# Altium schematic symbol library jlcpcb_2025_04_resistors_extended_2512.schlib: 2667 symbols (part 2 of 14) (continued)
## 25121WJ016JT4E
designator R?  Resistance: 1.6Ω  (hidden comment: *)
Resistor, 1.6Ω, ±5%, 1W, 200V, ±200ppm/℃, -55℃~+155℃, SMD 2512; Manufacturer: Uniroyal; Manufacturer Part Number: 25121WJ016JT4E; Supplier 1: LCSC; Supplier Part Number 1: C621287; JLCPCB Part Number: C621287; Power Rating: 1W; Category: Resistors; Package Size: 2512; JLCPCB Basic Part: Yes; Tolerance: ±5%; Voltage Rating: 200V; Temperature Coefficient: ±200ppm/℃; Temperature Rating: -55℃~+155℃; ComponentLink1Description: Datasheet; ComponentLink1URL: https://wmsc.lcsc.com/wmsc/upload/file/pdf/v2/lcsc/2206011100_UNI-ROYAL-Uniroyal-Elec-25121WJ016JT4E_C621287.pdf; ComponentLink2Description: JLCPCB Part URL; ComponentLink2URL: https://jlcpcb.com/partdetail/C621287
pins: 1, 2
1 alternate drawing of the same symbol

## 25121WJ016KT4E
designator R?  Resistance: 160mΩ  (hidden comment: *)
Resistor, 160mΩ, ±5%, 1W, 200V, ±800ppm/℃, -55℃~+155℃, SMD 2512; Manufacturer: Uniroyal; Manufacturer Part Number: 25121WJ016KT4E; Supplier 1: LCSC; Supplier Part Number 1: C419742; JLCPCB Part Number: C419742; Power Rating: 1W; Category: Resistors; Package Size: 2512; JLCPCB Basic Part: Yes; Tolerance: ±5%; Voltage Rating: 200V; Temperature Coefficient: ±800ppm/℃; Temperature Rating: -55℃~+155℃; ComponentLink1Description: Datasheet; ComponentLink1URL: https://wmsc.lcsc.com/wmsc/upload/file/pdf/v2/lcsc/2205312245_UNI-ROYAL-Uniroyal-Elec-25121WJ016KT4E_C419742.pdf; ComponentLink2Description: JLCPCB Part URL; ComponentLink2URL: https://jlcpcb.com/partdetail/C419742
pins: 1, 2
1 alternate drawing of the same symbol

## 25121WJ016LT4E
designator R?  Resistance: 16mΩ  (hidden comment: *)
Resistor, 16mΩ, ±5%, 1W, 200V, ±1000ppm/℃, -55℃~+155℃, SMD 2512; Manufacturer: Uniroyal; Manufacturer Part Number: 25121WJ016LT4E; Supplier 1: LCSC; Supplier Part Number 1: C406902; JLCPCB Part Number: C406902; Power Rating: 1W; Category: Resistors; Package Size: 2512; JLCPCB Basic Part: Yes; Tolerance: ±5%; Voltage Rating: 200V; Temperature Coefficient: ±1000ppm/℃; Temperature Rating: -55℃~+155℃; ComponentLink1Description: Datasheet; ComponentLink1URL: https://wmsc.lcsc.com/wmsc/upload/file/pdf/v2/lcsc/2205311945_UNI-ROYAL-Uniroyal-Elec-25121WJ016LT4E_C406902.pdf; ComponentLink2Description: JLCPCB Part URL; ComponentLink2URL: https://jlcpcb.com/partdetail/C406902
pins: 1, 2
1 alternate drawing of the same symbol

## 25121WJ018JT4E
designator R?  Resistance: 1.8Ω  (hidden comment: *)
Resistor, 1.8Ω, ±5%, 1W, 200V, ±200ppm/℃, -55℃~+155℃, SMD 2512; Manufacturer: Uniroyal; Manufacturer Part Number: 25121WJ018JT4E; Supplier 1: LCSC; Supplier Part Number 1: C25473; JLCPCB Part Number: C25473; Power Rating: 1W; Category: Resistors; Package Size: 2512; JLCPCB Basic Part: Yes; Tolerance: ±5%; Voltage Rating: 200V; Temperature Coefficient: ±200ppm/℃; Temperature Rating: -55℃~+155℃; ComponentLink1Description: Datasheet; ComponentLink1URL: https://wmsc.lcsc.com/wmsc/upload/file/pdf/v2/lcsc/2205311845_UNI-ROYAL-Uniroyal-Elec-25121WJ018JT4E_C25473.pdf; ComponentLink2Description: JLCPCB Part URL; ComponentLink2URL: https://jlcpcb.com/partdetail/C25473
pins: 1, 2
1 alternate drawing of the same symbol

## 25121WJ018KT4E
designator R?  Resistance: 180mΩ  (hidden comment: *)
Resistor, 180mΩ, ±5%, 1W, 200V, ±800ppm/℃, -55℃~+155℃, SMD 2512; Manufacturer: Uniroyal; Manufacturer Part Number: 25121WJ018KT4E; Supplier 1: LCSC; Supplier Part Number 1: C419739; JLCPCB Part Number: C419739; Power Rating: 1W; Category: Resistors; Package Size: 2512; JLCPCB Basic Part: Yes; Tolerance: ±5%; Voltage Rating: 200V; Temperature Coefficient: ±800ppm/℃; Temperature Rating: -55℃~+155℃; ComponentLink1Description: Datasheet; ComponentLink1URL: https://wmsc.lcsc.com/wmsc/upload/file/pdf/v2/lcsc/2205312245_UNI-ROYAL-Uniroyal-Elec-25121WJ018KT4E_C419739.pdf; ComponentLink2Description: JLCPCB Part URL; ComponentLink2URL: https://jlcpcb.com/partdetail/C419739
pins: 1, 2
1 alternate drawing of the same symbol

## 25121WJ018LT4E
designator R?  Resistance: 18mΩ  (hidden comment: *)
Resistor, 18mΩ, ±5%, 1W, 200V, ±1000ppm/℃, -55℃~+155℃, SMD 2512; Manufacturer: Uniroyal; Manufacturer Part Number: 25121WJ018LT4E; Supplier 1: LCSC; Supplier Part Number 1: C419738; JLCPCB Part Number: C419738; Power Rating: 1W; Category: Resistors; Package Size: 2512; JLCPCB Basic Part: Yes; Tolerance: ±5%; Voltage Rating: 200V; Temperature Coefficient: ±1000ppm/℃; Temperature Rating: -55℃~+155℃; ComponentLink1Description: Datasheet; ComponentLink1URL: https://wmsc.lcsc.com/wmsc/upload/file/pdf/v2/lcsc/2205312245_UNI-ROYAL-Uniroyal-Elec-25121WJ018LT4E_C419738.pdf; ComponentLink2Description: JLCPCB Part URL; ComponentLink2URL: https://jlcpcb.com/partdetail/C419738
pins: 1, 2
1 alternate drawing of the same symbol

## 25121WJ020JT4E
designator R?  Resistance: 2Ω  (hidden comment: *)
Resistor, 2Ω, ±5%, 1W, 200V, ±200ppm/℃, -55℃~+155℃, SMD 2512; Manufacturer: Uniroyal; Manufacturer Part Number: 25121WJ020JT4E; Supplier 1: LCSC; Supplier Part Number 1: C25479; JLCPCB Part Number: C25479; Power Rating: 1W; Category: Resistors; Package Size: 2512; JLCPCB Basic Part: Yes; Tolerance: ±5%; Voltage Rating: 200V; Temperature Coefficient: ±200ppm/℃; Temperature Rating: -55℃~+155℃; ComponentLink1Description: Datasheet; ComponentLink1URL: https://wmsc.lcsc.com/wmsc/upload/file/pdf/v2/lcsc/2205311845_UNI-ROYAL-Uniroyal-Elec-25121WJ020JT4E_C25479.pdf; ComponentLink2Description: JLCPCB Part URL; ComponentLink2URL: https://jlcpcb.com/partdetail/C25479
pins: 1, 2
1 alternate drawing of the same symbol

## 25121WJ022JT4E
designator R?  Resistance: 2.2Ω  (hidden comment: *)
Resistor, 2.2Ω, ±5%, 1W, 200V, ±400ppm/℃, -55℃~+155℃, SMD 2512; Manufacturer: Uniroyal; Manufacturer Part Number: 25121WJ022JT4E; Supplier 1: LCSC; Supplier Part Number 1: C25480; JLCPCB Part Number: C25480; Power Rating: 1W; Category: Resistors; Package Size: 2512; JLCPCB Basic Part: Yes; Tolerance: ±5%; Voltage Rating: 200V; Temperature Coefficient: ±400ppm/℃; Temperature Rating: -55℃~+155℃; ComponentLink1Description: Datasheet; ComponentLink1URL: https://wmsc.lcsc.com/wmsc/upload/file/pdf/v2/lcsc/2205311845_UNI-ROYAL-Uniroyal-Elec-25121WJ022JT4E_C25480.pdf; ComponentLink2Description: JLCPCB Part URL; ComponentLink2URL: https://jlcpcb.com/partdetail/C25480
pins: 1, 2
1 alternate drawing of the same symbol

## 25121WJ022KT4E
designator R?  Resistance: 220mΩ  (hidden comment: *)
Resistor, 220mΩ, ±5%, 1W, 200V, ±800ppm/℃, -55℃~+155℃, SMD 2512; Manufacturer: Uniroyal; Manufacturer Part Number: 25121WJ022KT4E; Supplier 1: LCSC; Supplier Part Number 1: C621273; JLCPCB Part Number: C621273; Power Rating: 1W; Category: Resistors; Package Size: 2512; JLCPCB Basic Part: Yes; Tolerance: ±5%; Voltage Rating: 200V; Temperature Coefficient: ±800ppm/℃; Temperature Rating: -55℃~+155℃; ComponentLink1Description: Datasheet; ComponentLink1URL: https://wmsc.lcsc.com/wmsc/upload/file/pdf/v2/lcsc/2206011100_UNI-ROYAL-Uniroyal-Elec-25121WJ022KT4E_C621273.pdf; ComponentLink2Description: JLCPCB Part URL; ComponentLink2URL: https://jlcpcb.com/partdetail/C621273
pins: 1, 2
1 alternate drawing of the same symbol

## 25121WJ022LT4E
designator R?  Resistance: 22mΩ  (hidden comment: *)
Resistor, 22mΩ, ±5%, 1W, 200V, ±1000ppm/℃, -55℃~+155℃, SMD 2512; Manufacturer: Uniroyal; Manufacturer Part Number: 25121WJ022LT4E; Supplier 1: LCSC; Supplier Part Number 1: C406901; JLCPCB Part Number: C406901; Power Rating: 1W; Category: Resistors; Package Size: 2512; JLCPCB Basic Part: Yes; Tolerance: ±5%; Voltage Rating: 200V; Temperature Coefficient: ±1000ppm/℃; Temperature Rating: -55℃~+155℃; ComponentLink1Description: Datasheet; ComponentLink1URL: https://wmsc.lcsc.com/wmsc/upload/file/pdf/v2/lcsc/2205311945_UNI-ROYAL-Uniroyal-Elec-25121WJ022LT4E_C406901.pdf; ComponentLink2Description: JLCPCB Part URL; ComponentLink2URL: https://jlcpcb.com/partdetail/C406901
pins: 1, 2
1 alternate drawing of the same symbol

## 25121WJ024JT4E
designator R?  Resistance: 2.4Ω  (hidden comment: *)
Resistor, 2.4Ω, ±5%, 1W, 200V, ±200ppm/℃, -55℃~+155℃, SMD 2512; Manufacturer: Uniroyal; Manufacturer Part Number: 25121WJ024JT4E; Supplier 1: LCSC; Supplier Part Number 1: C25481; JLCPCB Part Number: C25481; Power Rating: 1W; Category: Resistors; Package Size: 2512; JLCPCB Basic Part: Yes; Tolerance: ±5%; Voltage Rating: 200V; Temperature Coefficient: ±200ppm/℃; Temperature Rating: -55℃~+155℃; ComponentLink1Description: Datasheet; ComponentLink1URL: https://wmsc.lcsc.com/wmsc/upload/file/pdf/v2/lcsc/2205311845_UNI-ROYAL-Uniroyal-Elec-25121WJ024JT4E_C25481.pdf; ComponentLink2Description: JLCPCB Part URL; ComponentLink2URL: https://jlcpcb.com/partdetail/C25481
pins: 1, 2
1 alternate drawing of the same symbol

## 25121WJ024KT4E
designator R?  Resistance: 240mΩ  (hidden comment: *)
Resistor, 240mΩ, ±5%, 1W, 200V, ±800ppm/℃, -55℃~+155℃, SMD 2512; Manufacturer: Uniroyal; Manufacturer Part Number: 25121WJ024KT4E; Supplier 1: LCSC; Supplier Part Number 1: C419734; JLCPCB Part Number: C419734; Power Rating: 1W; Category: Resistors; Package Size: 2512; JLCPCB Basic Part: Yes; Tolerance: ±5%; Voltage Rating: 200V; Temperature Coefficient: ±800ppm/℃; Temperature Rating: -55℃~+155℃; ComponentLink1Description: Datasheet; ComponentLink1URL: https://wmsc.lcsc.com/wmsc/upload/file/pdf/v2/lcsc/2205312245_UNI-ROYAL-Uniroyal-Elec-25121WJ024KT4E_C419734.pdf; ComponentLink2Description: JLCPCB Part URL; ComponentLink2URL: https://jlcpcb.com/partdetail/C419734
pins: 1, 2
1 alternate drawing of the same symbol

## 25121WJ025KT4E
designator R?  Resistance: 250mΩ  (hidden comment: *)
Resistor, 250mΩ, ±5%, 1W, 200V, ±800ppm/℃, -55℃~+155℃, SMD 2512; Manufacturer: Uniroyal; Manufacturer Part Number: 25121WJ025KT4E; Supplier 1: LCSC; Supplier Part Number 1: C621274; JLCPCB Part Number: C621274; Power Rating: 1W; Category: Resistors; Package Size: 2512; JLCPCB Basic Part: Yes; Tolerance: ±5%; Voltage Rating: 200V; Temperature Coefficient: ±800ppm/℃; Temperature Rating: -55℃~+155℃; ComponentLink1Description: Datasheet; ComponentLink1URL: https://wmsc.lcsc.com/wmsc/upload/file/pdf/v2/lcsc/2206011100_UNI-ROYAL-Uniroyal-Elec-25121WJ025KT4E_C621274.pdf; ComponentLink2Description: JLCPCB Part URL; ComponentLink2URL: https://jlcpcb.com/partdetail/C621274
pins: 1, 2
1 alternate drawing of the same symbol

## 25121WJ027JT4E
designator R?  Resistance: 2.7Ω  (hidden comment: *)
Resistor, 2.7Ω, ±5%, 1W, 200V, ±200ppm/℃, -55℃~+155℃, SMD 2512; Manufacturer: Uniroyal; Manufacturer Part Number: 25121WJ027JT4E; Supplier 1: LCSC; Supplier Part Number 1: C621299; JLCPCB Part Number: C621299; Power Rating: 1W; Category: Resistors; Package Size: 2512; JLCPCB Basic Part: Yes; Tolerance: ±5%; Voltage Rating: 200V; Temperature Coefficient: ±200ppm/℃; Temperature Rating: -55℃~+155℃; ComponentLink1Description: Datasheet; ComponentLink1URL: https://wmsc.lcsc.com/wmsc/upload/file/pdf/v2/lcsc/2206011100_UNI-ROYAL-Uniroyal-Elec-25121WJ027JT4E_C621299.pdf; ComponentLink2Description: JLCPCB Part URL; ComponentLink2URL: https://jlcpcb.com/partdetail/C621299
pins: 1, 2
1 alternate drawing of the same symbol

## 25121WJ027LT4E
designator R?  Resistance: 27mΩ  (hidden comment: *)
Resistor, 27mΩ, ±5%, 1W, 200V, ±800ppm/℃, -55℃~+155℃, SMD 2512; Manufacturer: Uniroyal; Manufacturer Part Number: 25121WJ027LT4E; Supplier 1: LCSC; Supplier Part Number 1: C406899; JLCPCB Part Number: C406899; Power Rating: 1W; Category: Resistors; Package Size: 2512; JLCPCB Basic Part: Yes; Tolerance: ±5%; Voltage Rating: 200V; Temperature Coefficient: ±800ppm/℃; Temperature Rating: -55℃~+155℃; ComponentLink1Description: Datasheet; ComponentLink1URL: https://wmsc.lcsc.com/wmsc/upload/file/pdf/v2/lcsc/2205311945_UNI-ROYAL-Uniroyal-Elec-25121WJ027LT4E_C406899.pdf; ComponentLink2Description: JLCPCB Part URL; ComponentLink2URL: https://jlcpcb.com/partdetail/C406899
pins: 1, 2
1 alternate drawing of the same symbol

## 25121WJ030JT4E
designator R?  Resistance: 3Ω  (hidden comment: *)
Resistor, 3Ω, ±5%, 1W, 200V, ±200ppm/℃, -55℃~+155℃, SMD 2512; Manufacturer: Uniroyal; Manufacturer Part Number: 25121WJ030JT4E; Supplier 1: LCSC; Supplier Part Number 1: C25486; JLCPCB Part Number: C25486; Power Rating: 1W; Category: Resistors; Package Size: 2512; JLCPCB Basic Part: Yes; Tolerance: ±5%; Voltage Rating: 200V; Temperature Coefficient: ±200ppm/℃; Temperature Rating: -55℃~+155℃; ComponentLink1Description: Datasheet; ComponentLink1URL: https://wmsc.lcsc.com/wmsc/upload/file/pdf/v2/lcsc/2205311845_UNI-ROYAL-Uniroyal-Elec-25121WJ030JT4E_C25486.pdf; ComponentLink2Description: JLCPCB Part URL; ComponentLink2URL: https://jlcpcb.com/partdetail/C25486
pins: 1, 2
1 alternate drawing of the same symbol

## 25121WJ030KT4E
designator R?  Resistance: 300mΩ  (hidden comment: *)
Resistor, 300mΩ, ±5%, 1W, 200V, ±800ppm/℃, -55℃~+155℃, SMD 2512; Manufacturer: Uniroyal; Manufacturer Part Number: 25121WJ030KT4E; Supplier 1: LCSC; Supplier Part Number 1: C621277; JLCPCB Part Number: C621277; Power Rating: 1W; Category: Resistors; Package Size: 2512; JLCPCB Basic Part: Yes; Tolerance: ±5%; Voltage Rating: 200V; Temperature Coefficient: ±800ppm/℃; Temperature Rating: -55℃~+155℃; ComponentLink1Description: Datasheet; ComponentLink1URL: https://wmsc.lcsc.com/wmsc/upload/file/pdf/v2/lcsc/2206011100_UNI-ROYAL-Uniroyal-Elec-25121WJ030KT4E_C621277.pdf; ComponentLink2Description: JLCPCB Part URL; ComponentLink2URL: https://jlcpcb.com/partdetail/C621277
pins: 1, 2
1 alternate drawing of the same symbol

## 25121WJ030LT4E
designator R?  Resistance: 30mΩ  (hidden comment: *)
Resistor, 30mΩ, ±5%, 1W, 200V, ±1000ppm/℃, -55℃~+155℃, SMD 2512; Manufacturer: Uniroyal; Manufacturer Part Number: 25121WJ030LT4E; Supplier 1: LCSC; Supplier Part Number 1: C621267; JLCPCB Part Number: C621267; Power Rating: 1W; Category: Resistors; Package Size: 2512; JLCPCB Basic Part: Yes; Tolerance: ±5%; Voltage Rating: 200V; Temperature Coefficient: ±1000ppm/℃; Temperature Rating: -55℃~+155℃; ComponentLink1Description: Datasheet; ComponentLink1URL: https://wmsc.lcsc.com/wmsc/upload/file/pdf/v2/lcsc/2206011100_UNI-ROYAL-Uniroyal-Elec-25121WJ030LT4E_C621267.pdf; ComponentLink2Description: JLCPCB Part URL; ComponentLink2URL: https://jlcpcb.com/partdetail/C621267
pins: 1, 2
1 alternate drawing of the same symbol

## 25121WJ033JT4E
designator R?  Resistance: 3.3Ω  (hidden comment: *)
Resistor, 3.3Ω, ±5%, 1W, 200V, ±400ppm/℃, -55℃~+155℃, SMD 2512; Manufacturer: Uniroyal; Manufacturer Part Number: 25121WJ033JT4E; Supplier 1: LCSC; Supplier Part Number 1: C621302; JLCPCB Part Number: C621302; Power Rating: 1W; Category: Resistors; Package Size: 2512; JLCPCB Basic Part: Yes; Tolerance: ±5%; Voltage Rating: 200V; Temperature Coefficient: ±400ppm/℃; Temperature Rating: -55℃~+155℃; ComponentLink1Description: Datasheet; ComponentLink1URL: https://wmsc.lcsc.com/wmsc/upload/file/pdf/v2/lcsc/2206011100_UNI-ROYAL-Uniroyal-Elec-25121WJ033JT4E_C621302.pdf; ComponentLink2Description: JLCPCB Part URL; ComponentLink2URL: https://jlcpcb.com/partdetail/C621302
pins: 1, 2
1 alternate drawing of the same symbol

## 25121WJ033KT4E
designator R?  Resistance: 330mΩ  (hidden comment: *)
Resistor, 330mΩ, ±5%, 1W, 200V, ±800ppm/℃, -55℃~+155℃, SMD 2512; Manufacturer: Uniroyal; Manufacturer Part Number: 25121WJ033KT4E; Supplier 1: LCSC; Supplier Part Number 1: C123831; JLCPCB Part Number: C123831; Power Rating: 1W; Category: Resistors; Package Size: 2512; JLCPCB Basic Part: Yes; Tolerance: ±5%; Voltage Rating: 200V; Temperature Coefficient: ±800ppm/℃; Temperature Rating: -55℃~+155℃; ComponentLink1Description: Datasheet; ComponentLink1URL: https://wmsc.lcsc.com/wmsc/upload/file/pdf/v2/lcsc/2205312316_UNI-ROYAL-Uniroyal-Elec-25121WJ033KT4E_C123831.pdf; ComponentLink2Description: JLCPCB Part URL; ComponentLink2URL: https://jlcpcb.com/partdetail/C123831
pins: 1, 2
1 alternate drawing of the same symbol

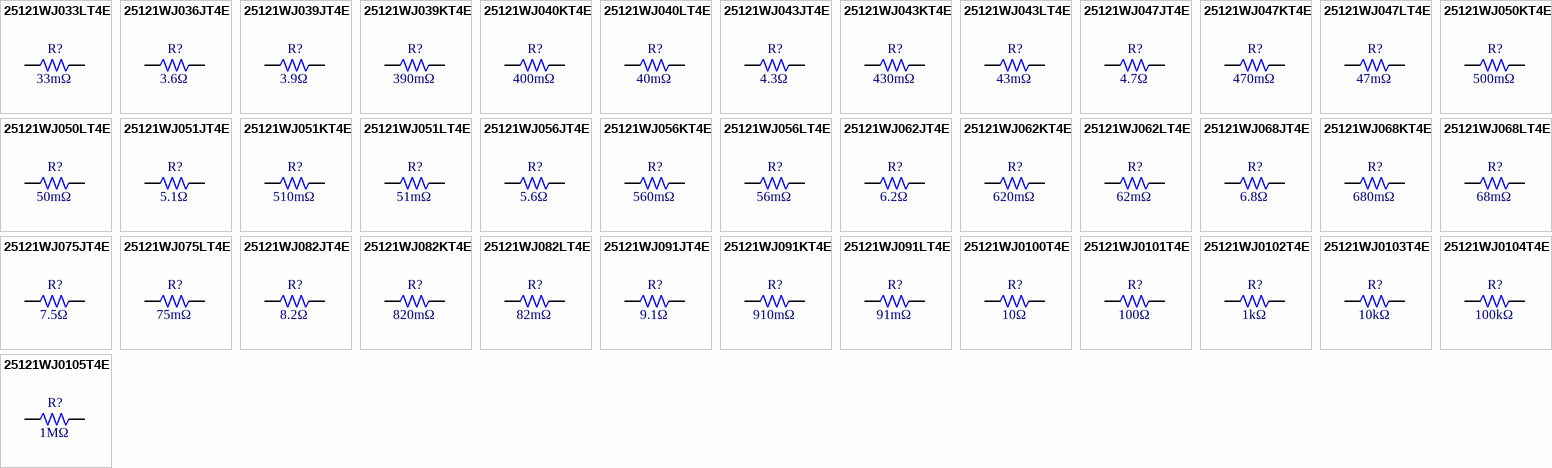
[diagram p9: symbols 25121WJ033LT4E to 25121WJ0105T4E]

## 25121WJ033LT4E
designator R?  Resistance: 33mΩ  (hidden comment: *)
Resistor, 33mΩ, ±5%, 1W, 200V, ±800ppm/℃, -55℃~+155℃, SMD 2512; Manufacturer: Uniroyal; Manufacturer Part Number: 25121WJ033LT4E; Supplier 1: LCSC; Supplier Part Number 1: C55739; JLCPCB Part Number: C55739; Power Rating: 1W; Category: Resistors; Package Size: 2512; JLCPCB Basic Part: Yes; Tolerance: ±5%; Voltage Rating: 200V; Temperature Coefficient: ±800ppm/℃; Temperature Rating: -55℃~+155℃; ComponentLink1Description: Datasheet; ComponentLink1URL: https://wmsc.lcsc.com/wmsc/upload/file/pdf/v2/lcsc/2205312345_UNI-ROYAL-Uniroyal-Elec-25121WJ033LT4E_C55739.pdf; ComponentLink2Description: JLCPCB Part URL; ComponentLink2URL: https://jlcpcb.com/partdetail/C55739
pins: 1, 2
1 alternate drawing of the same symbol

## 25121WJ036JT4E
designator R?  Resistance: 3.6Ω  (hidden comment: *)
Resistor, 3.6Ω, ±5%, 1W, 200V, ±200ppm/℃, -55℃~+155℃, SMD 2512; Manufacturer: Uniroyal; Manufacturer Part Number: 25121WJ036JT4E; Supplier 1: LCSC; Supplier Part Number 1: C621303; JLCPCB Part Number: C621303; Power Rating: 1W; Category: Resistors; Package Size: 2512; JLCPCB Basic Part: Yes; Tolerance: ±5%; Voltage Rating: 200V; Temperature Coefficient: ±200ppm/℃; Temperature Rating: -55℃~+155℃; ComponentLink1Description: Datasheet; ComponentLink1URL: https://wmsc.lcsc.com/wmsc/upload/file/pdf/v2/lcsc/2206011100_UNI-ROYAL-Uniroyal-Elec-25121WJ036JT4E_C621303.pdf; ComponentLink2Description: JLCPCB Part URL; ComponentLink2URL: https://jlcpcb.com/partdetail/C621303
pins: 1, 2
1 alternate drawing of the same symbol

## 25121WJ039JT4E
designator R?  Resistance: 3.9Ω  (hidden comment: *)
Resistor, 3.9Ω, ±5%, 1W, 200V, ±200ppm/℃, -55℃~+155℃, SMD 2512; Manufacturer: Uniroyal; Manufacturer Part Number: 25121WJ039JT4E; Supplier 1: LCSC; Supplier Part Number 1: C48395; JLCPCB Part Number: C48395; Power Rating: 1W; Category: Resistors; Package Size: 2512; JLCPCB Basic Part: Yes; Tolerance: ±5%; Voltage Rating: 200V; Temperature Coefficient: ±200ppm/℃; Temperature Rating: -55℃~+155℃; ComponentLink1Description: Datasheet; ComponentLink1URL: https://wmsc.lcsc.com/wmsc/upload/file/pdf/v2/lcsc/2206010000_UNI-ROYAL-Uniroyal-Elec-25121WJ039JT4E_C48395.pdf; ComponentLink2Description: JLCPCB Part URL; ComponentLink2URL: https://jlcpcb.com/partdetail/C48395
pins: 1, 2
1 alternate drawing of the same symbol

## 25121WJ039KT4E
designator R?  Resistance: 390mΩ  (hidden comment: *)
Resistor, 390mΩ, ±5%, 1W, 200V, ±800ppm/℃, -55℃~+155℃, SMD 2512; Manufacturer: Uniroyal; Manufacturer Part Number: 25121WJ039KT4E; Supplier 1: LCSC; Supplier Part Number 1: C621276; JLCPCB Part Number: C621276; Power Rating: 1W; Category: Resistors; Package Size: 2512; JLCPCB Basic Part: Yes; Tolerance: ±5%; Voltage Rating: 200V; Temperature Coefficient: ±800ppm/℃; Temperature Rating: -55℃~+155℃; ComponentLink1Description: Datasheet; ComponentLink1URL: https://wmsc.lcsc.com/wmsc/upload/file/pdf/v2/lcsc/2206011100_UNI-ROYAL-Uniroyal-Elec-25121WJ039KT4E_C621276.pdf; ComponentLink2Description: JLCPCB Part URL; ComponentLink2URL: https://jlcpcb.com/partdetail/C621276
pins: 1, 2
1 alternate drawing of the same symbol

## 25121WJ040KT4E
designator R?  Resistance: 400mΩ  (hidden comment: *)
Resistor, 400mΩ, ±5%, 1W, 200V, ±800ppm/℃, -55℃~+155℃, SMD 2512; Manufacturer: Uniroyal; Manufacturer Part Number: 25121WJ040KT4E; Supplier 1: LCSC; Supplier Part Number 1: C621279; JLCPCB Part Number: C621279; Power Rating: 1W; Category: Resistors; Package Size: 2512; JLCPCB Basic Part: Yes; Tolerance: ±5%; Voltage Rating: 200V; Temperature Coefficient: ±800ppm/℃; Temperature Rating: -55℃~+155℃; ComponentLink1Description: Datasheet; ComponentLink1URL: https://wmsc.lcsc.com/wmsc/upload/file/pdf/v2/lcsc/2206011100_UNI-ROYAL-Uniroyal-Elec-25121WJ040KT4E_C621279.pdf; ComponentLink2Description: JLCPCB Part URL; ComponentLink2URL: https://jlcpcb.com/partdetail/C621279
pins: 1, 2
1 alternate drawing of the same symbol

## 25121WJ040LT4E
designator R?  Resistance: 40mΩ  (hidden comment: *)
Resistor, 40mΩ, ±5%, 1W, 200V, ±800ppm/℃, -55℃~+155℃, SMD 2512; Manufacturer: Uniroyal; Manufacturer Part Number: 25121WJ040LT4E; Supplier 1: LCSC; Supplier Part Number 1: C419725; JLCPCB Part Number: C419725; Power Rating: 1W; Category: Resistors; Package Size: 2512; JLCPCB Basic Part: Yes; Tolerance: ±5%; Voltage Rating: 200V; Temperature Coefficient: ±800ppm/℃; Temperature Rating: -55℃~+155℃; ComponentLink1Description: Datasheet; ComponentLink1URL: https://wmsc.lcsc.com/wmsc/upload/file/pdf/v2/lcsc/2205312245_UNI-ROYAL-Uniroyal-Elec-25121WJ040LT4E_C419725.pdf; ComponentLink2Description: JLCPCB Part URL; ComponentLink2URL: https://jlcpcb.com/partdetail/C419725
pins: 1, 2
1 alternate drawing of the same symbol

## 25121WJ043JT4E
designator R?  Resistance: 4.3Ω  (hidden comment: *)
Resistor, 4.3Ω, ±5%, 1W, 200V, ±200ppm/℃, -55℃~+155℃, SMD 2512; Manufacturer: Uniroyal; Manufacturer Part Number: 25121WJ043JT4E; Supplier 1: LCSC; Supplier Part Number 1: C25488; JLCPCB Part Number: C25488; Power Rating: 1W; Category: Resistors; Package Size: 2512; JLCPCB Basic Part: Yes; Tolerance: ±5%; Voltage Rating: 200V; Temperature Coefficient: ±200ppm/℃; Temperature Rating: -55℃~+155℃; ComponentLink1Description: Datasheet; ComponentLink1URL: https://wmsc.lcsc.com/wmsc/upload/file/pdf/v2/lcsc/2205311845_UNI-ROYAL-Uniroyal-Elec-25121WJ043JT4E_C25488.pdf; ComponentLink2Description: JLCPCB Part URL; ComponentLink2URL: https://jlcpcb.com/partdetail/C25488
pins: 1, 2
1 alternate drawing of the same symbol

## 25121WJ043KT4E
designator R?  Resistance: 430mΩ  (hidden comment: *)
Resistor, 430mΩ, ±5%, 1W, 200V, ±800ppm/℃, -55℃~+155℃, SMD 2512; Manufacturer: Uniroyal; Manufacturer Part Number: 25121WJ043KT4E; Supplier 1: LCSC; Supplier Part Number 1: C419721; JLCPCB Part Number: C419721; Power Rating: 1W; Category: Resistors; Package Size: 2512; JLCPCB Basic Part: Yes; Tolerance: ±5%; Voltage Rating: 200V; Temperature Coefficient: ±800ppm/℃; Temperature Rating: -55℃~+155℃; ComponentLink1Description: Datasheet; ComponentLink1URL: https://wmsc.lcsc.com/wmsc/upload/file/pdf/v2/lcsc/2205312245_UNI-ROYAL-Uniroyal-Elec-25121WJ043KT4E_C419721.pdf; ComponentLink2Description: JLCPCB Part URL; ComponentLink2URL: https://jlcpcb.com/partdetail/C419721
pins: 1, 2
1 alternate drawing of the same symbol

## 25121WJ043LT4E
designator R?  Resistance: 43mΩ  (hidden comment: *)
Resistor, 43mΩ, ±5%, 1W, 200V, ±800ppm/℃, -55℃~+155℃, SMD 2512; Manufacturer: Uniroyal; Manufacturer Part Number: 25121WJ043LT4E; Supplier 1: LCSC; Supplier Part Number 1: C406894; JLCPCB Part Number: C406894; Power Rating: 1W; Category: Resistors; Package Size: 2512; JLCPCB Basic Part: Yes; Tolerance: ±5%; Voltage Rating: 200V; Temperature Coefficient: ±800ppm/℃; Temperature Rating: -55℃~+155℃; ComponentLink1Description: Datasheet; ComponentLink1URL: https://wmsc.lcsc.com/wmsc/upload/file/pdf/v2/lcsc/2205311945_UNI-ROYAL-Uniroyal-Elec-25121WJ043LT4E_C406894.pdf; ComponentLink2Description: JLCPCB Part URL; ComponentLink2URL: https://jlcpcb.com/partdetail/C406894
pins: 1, 2
1 alternate drawing of the same symbol

## 25121WJ047JT4E
designator R?  Resistance: 4.7Ω  (hidden comment: *)
Resistor, 4.7Ω, ±5%, 1W, 200V, ±200ppm/℃, -55℃~+155℃, SMD 2512; Manufacturer: Uniroyal; Manufacturer Part Number: 25121WJ047JT4E; Supplier 1: LCSC; Supplier Part Number 1: C25489; JLCPCB Part Number: C25489; Power Rating: 1W; Category: Resistors; Package Size: 2512; JLCPCB Basic Part: Yes; Tolerance: ±5%; Voltage Rating: 200V; Temperature Coefficient: ±200ppm/℃; Temperature Rating: -55℃~+155℃; ComponentLink1Description: Datasheet; ComponentLink1URL: https://wmsc.lcsc.com/wmsc/upload/file/pdf/v2/lcsc/2205311845_UNI-ROYAL-Uniroyal-Elec-25121WJ047JT4E_C25489.pdf; ComponentLink2Description: JLCPCB Part URL; ComponentLink2URL: https://jlcpcb.com/partdetail/C25489
pins: 1, 2
1 alternate drawing of the same symbol

## 25121WJ047KT4E
designator R?  Resistance: 470mΩ  (hidden comment: *)
Resistor, 470mΩ, ±5%, 1W, 200V, ±800ppm/℃, -55℃~+155℃, SMD 2512; Manufacturer: Uniroyal; Manufacturer Part Number: 25121WJ047KT4E; Supplier 1: LCSC; Supplier Part Number 1: C621278; JLCPCB Part Number: C621278; Power Rating: 1W; Category: Resistors; Package Size: 2512; JLCPCB Basic Part: Yes; Tolerance: ±5%; Voltage Rating: 200V; Temperature Coefficient: ±800ppm/℃; Temperature Rating: -55℃~+155℃; ComponentLink1Description: Datasheet; ComponentLink1URL: https://wmsc.lcsc.com/wmsc/upload/file/pdf/v2/lcsc/2206011100_UNI-ROYAL-Uniroyal-Elec-25121WJ047KT4E_C621278.pdf; ComponentLink2Description: JLCPCB Part URL; ComponentLink2URL: https://jlcpcb.com/partdetail/C621278
pins: 1, 2
1 alternate drawing of the same symbol

## 25121WJ047LT4E
designator R?  Resistance: 47mΩ  (hidden comment: *)
Resistor, 47mΩ, ±5%, 1W, 200V, ±800ppm/℃, -55℃~+155℃, SMD 2512; Manufacturer: Uniroyal; Manufacturer Part Number: 25121WJ047LT4E; Supplier 1: LCSC; Supplier Part Number 1: C621268; JLCPCB Part Number: C621268; Power Rating: 1W; Category: Resistors; Package Size: 2512; JLCPCB Basic Part: Yes; Tolerance: ±5%; Voltage Rating: 200V; Temperature Coefficient: ±800ppm/℃; Temperature Rating: -55℃~+155℃; ComponentLink1Description: Datasheet; ComponentLink1URL: https://wmsc.lcsc.com/wmsc/upload/file/pdf/v2/lcsc/2206011100_UNI-ROYAL-Uniroyal-Elec-25121WJ047LT4E_C621268.pdf; ComponentLink2Description: JLCPCB Part URL; ComponentLink2URL: https://jlcpcb.com/partdetail/C621268
pins: 1, 2
1 alternate drawing of the same symbol

## 25121WJ050KT4E
designator R?  Resistance: 500mΩ  (hidden comment: *)
Resistor, 500mΩ, ±5%, 1W, 200V, ±800ppm/℃, -55℃~+155℃, SMD 2512; Manufacturer: Uniroyal; Manufacturer Part Number: 25121WJ050KT4E; Supplier 1: LCSC; Supplier Part Number 1: C621282; JLCPCB Part Number: C621282; Power Rating: 1W; Category: Resistors; Package Size: 2512; JLCPCB Basic Part: Yes; Tolerance: ±5%; Voltage Rating: 200V; Temperature Coefficient: ±800ppm/℃; Temperature Rating: -55℃~+155℃; ComponentLink1Description: Datasheet; ComponentLink1URL: https://wmsc.lcsc.com/wmsc/upload/file/pdf/v2/lcsc/2206011100_UNI-ROYAL-Uniroyal-Elec-25121WJ050KT4E_C621282.pdf; ComponentLink2Description: JLCPCB Part URL; ComponentLink2URL: https://jlcpcb.com/partdetail/C621282
pins: 1, 2
1 alternate drawing of the same symbol

## 25121WJ050LT4E
designator R?  Resistance: 50mΩ  (hidden comment: *)
Resistor, 50mΩ, ±5%, 1W, 200V, ±800ppm/℃, -55℃~+155℃, SMD 2512; Manufacturer: Uniroyal; Manufacturer Part Number: 25121WJ050LT4E; Supplier 1: LCSC; Supplier Part Number 1: C474258; JLCPCB Part Number: C474258; Power Rating: 1W; Category: Resistors; Package Size: 2512; JLCPCB Basic Part: Yes; Tolerance: ±5%; Voltage Rating: 200V; Temperature Coefficient: ±800ppm/℃; Temperature Rating: -55℃~+155℃; ComponentLink1Description: Datasheet; ComponentLink1URL: https://wmsc.lcsc.com/wmsc/upload/file/pdf/v2/lcsc/2206011100_UNI-ROYAL-Uniroyal-Elec-25121WJ050LT4E_C474258.pdf; ComponentLink2Description: JLCPCB Part URL; ComponentLink2URL: https://jlcpcb.com/partdetail/C474258
pins: 1, 2
1 alternate drawing of the same symbol

## 25121WJ051JT4E
designator R?  Resistance: 5.1Ω  (hidden comment: *)
Resistor, 5.1Ω, ±5%, 1W, 200V, ±200ppm/℃, -55℃~+155℃, SMD 2512; Manufacturer: Uniroyal; Manufacturer Part Number: 25121WJ051JT4E; Supplier 1: LCSC; Supplier Part Number 1: C70196; JLCPCB Part Number: C70196; Power Rating: 1W; Category: Resistors; Package Size: 2512; JLCPCB Basic Part: Yes; Tolerance: ±5%; Voltage Rating: 200V; Temperature Coefficient: ±200ppm/℃; Temperature Rating: -55℃~+155℃; ComponentLink1Description: Datasheet; ComponentLink1URL: https://wmsc.lcsc.com/wmsc/upload/file/pdf/v2/lcsc/2205312345_UNI-ROYAL-Uniroyal-Elec-25121WJ051JT4E_C70196.pdf; ComponentLink2Description: JLCPCB Part URL; ComponentLink2URL: https://jlcpcb.com/partdetail/C70196
pins: 1, 2
1 alternate drawing of the same symbol

## 25121WJ051KT4E
designator R?  Resistance: 510mΩ  (hidden comment: *)
Resistor, 510mΩ, ±5%, 1W, 200V, ±800ppm/℃, -55℃~+155℃, SMD 2512; Manufacturer: Uniroyal; Manufacturer Part Number: 25121WJ051KT4E; Supplier 1: LCSC; Supplier Part Number 1: C621280; JLCPCB Part Number: C621280; Power Rating: 1W; Category: Resistors; Package Size: 2512; JLCPCB Basic Part: Yes; Tolerance: ±5%; Voltage Rating: 200V; Temperature Coefficient: ±800ppm/℃; Temperature Rating: -55℃~+155℃; ComponentLink1Description: Datasheet; ComponentLink1URL: https://wmsc.lcsc.com/wmsc/upload/file/pdf/v2/lcsc/2206011100_UNI-ROYAL-Uniroyal-Elec-25121WJ051KT4E_C621280.pdf; ComponentLink2Description: JLCPCB Part URL; ComponentLink2URL: https://jlcpcb.com/partdetail/C621280
pins: 1, 2
1 alternate drawing of the same symbol

## 25121WJ051LT4E
designator R?  Resistance: 51mΩ  (hidden comment: *)
Resistor, 51mΩ, ±5%, 1W, 200V, ±800ppm/℃, -55℃~+155℃, SMD 2512; Manufacturer: Uniroyal; Manufacturer Part Number: 25121WJ051LT4E; Supplier 1: LCSC; Supplier Part Number 1: C784358; JLCPCB Part Number: C784358; Power Rating: 1W; Category: Resistors; Package Size: 2512; JLCPCB Basic Part: Yes; Tolerance: ±5%; Voltage Rating: 200V; Temperature Coefficient: ±800ppm/℃; Temperature Rating: -55℃~+155℃; ComponentLink1Description: Datasheet; ComponentLink1URL: https://wmsc.lcsc.com/wmsc/upload/file/pdf/v2/lcsc/2206011045_UNI-ROYAL-Uniroyal-Elec-25121WJ051LT4E_C784358.pdf; ComponentLink2Description: JLCPCB Part URL; ComponentLink2URL: https://jlcpcb.com/partdetail/C784358
pins: 1, 2
1 alternate drawing of the same symbol

## 25121WJ056JT4E
designator R?  Resistance: 5.6Ω  (hidden comment: *)
Resistor, 5.6Ω, ±5%, 1W, 200V, ±200ppm/℃, -55℃~+155℃, SMD 2512; Manufacturer: Uniroyal; Manufacturer Part Number: 25121WJ056JT4E; Supplier 1: LCSC; Supplier Part Number 1: C621309; JLCPCB Part Number: C621309; Power Rating: 1W; Category: Resistors; Package Size: 2512; JLCPCB Basic Part: Yes; Tolerance: ±5%; Voltage Rating: 200V; Temperature Coefficient: ±200ppm/℃; Temperature Rating: -55℃~+155℃; ComponentLink1Description: Datasheet; ComponentLink1URL: https://wmsc.lcsc.com/wmsc/upload/file/pdf/v2/lcsc/2206011100_UNI-ROYAL-Uniroyal-Elec-25121WJ056JT4E_C621309.pdf; ComponentLink2Description: JLCPCB Part URL; ComponentLink2URL: https://jlcpcb.com/partdetail/C621309
pins: 1, 2
1 alternate drawing of the same symbol

## 25121WJ056KT4E
designator R?  Resistance: 560mΩ  (hidden comment: *)
Resistor, 560mΩ, ±5%, 1W, 200V, ±800ppm/℃, -55℃~+155℃, SMD 2512; Manufacturer: Uniroyal; Manufacturer Part Number: 25121WJ056KT4E; Supplier 1: LCSC; Supplier Part Number 1: C621281; JLCPCB Part Number: C621281; Power Rating: 1W; Category: Resistors; Package Size: 2512; JLCPCB Basic Part: Yes; Tolerance: ±5%; Voltage Rating: 200V; Temperature Coefficient: ±800ppm/℃; Temperature Rating: -55℃~+155℃; ComponentLink1Description: Datasheet; ComponentLink1URL: https://wmsc.lcsc.com/wmsc/upload/file/pdf/v2/lcsc/2206011100_UNI-ROYAL-Uniroyal-Elec-25121WJ056KT4E_C621281.pdf; ComponentLink2Description: JLCPCB Part URL; ComponentLink2URL: https://jlcpcb.com/partdetail/C621281
pins: 1, 2
1 alternate drawing of the same symbol

## 25121WJ056LT4E
designator R?  Resistance: 56mΩ  (hidden comment: *)
Resistor, 56mΩ, ±5%, 1W, 200V, ±800ppm/℃, -55℃~+155℃, SMD 2512; Manufacturer: Uniroyal; Manufacturer Part Number: 25121WJ056LT4E; Supplier 1: LCSC; Supplier Part Number 1: C784359; JLCPCB Part Number: C784359; Power Rating: 1W; Category: Resistors; Package Size: 2512; JLCPCB Basic Part: Yes; Tolerance: ±5%; Voltage Rating: 200V; Temperature Coefficient: ±800ppm/℃; Temperature Rating: -55℃~+155℃; ComponentLink1Description: Datasheet; ComponentLink1URL: https://wmsc.lcsc.com/wmsc/upload/file/pdf/v2/lcsc/2206011045_UNI-ROYAL-Uniroyal-Elec-25121WJ056LT4E_C784359.pdf; ComponentLink2Description: JLCPCB Part URL; ComponentLink2URL: https://jlcpcb.com/partdetail/C784359
pins: 1, 2
1 alternate drawing of the same symbol

## 25121WJ062JT4E
designator R?  Resistance: 6.2Ω  (hidden comment: *)
Resistor, 6.2Ω, ±5%, 1W, 200V, ±200ppm/℃, -55℃~+155℃, SMD 2512; Manufacturer: Uniroyal; Manufacturer Part Number: 25121WJ062JT4E; Supplier 1: LCSC; Supplier Part Number 1: C621312; JLCPCB Part Number: C621312; Power Rating: 1W; Category: Resistors; Package Size: 2512; JLCPCB Basic Part: Yes; Tolerance: ±5%; Voltage Rating: 200V; Temperature Coefficient: ±200ppm/℃; Temperature Rating: -55℃~+155℃; ComponentLink1Description: Datasheet; ComponentLink1URL: https://wmsc.lcsc.com/wmsc/upload/file/pdf/v2/lcsc/2206011100_UNI-ROYAL-Uniroyal-Elec-25121WJ062JT4E_C621312.pdf; ComponentLink2Description: JLCPCB Part URL; ComponentLink2URL: https://jlcpcb.com/partdetail/C621312
pins: 1, 2
1 alternate drawing of the same symbol

## 25121WJ062KT4E
designator R?  Resistance: 620mΩ  (hidden comment: *)
Resistor, 620mΩ, ±5%, 1W, 200V, ±800ppm/℃, -55℃~+155℃, SMD 2512; Manufacturer: Uniroyal; Manufacturer Part Number: 25121WJ062KT4E; Supplier 1: LCSC; Supplier Part Number 1: C25470; JLCPCB Part Number: C25470; Power Rating: 1W; Category: Resistors; Package Size: 2512; JLCPCB Basic Part: Yes; Tolerance: ±5%; Voltage Rating: 200V; Temperature Coefficient: ±800ppm/℃; Temperature Rating: -55℃~+155℃; ComponentLink1Description: Datasheet; ComponentLink1URL: https://wmsc.lcsc.com/wmsc/upload/file/pdf/v2/lcsc/2205311845_UNI-ROYAL-Uniroyal-Elec-25121WJ062KT4E_C25470.pdf; ComponentLink2Description: JLCPCB Part URL; ComponentLink2URL: https://jlcpcb.com/partdetail/C25470
pins: 1, 2
1 alternate drawing of the same symbol

## 25121WJ062LT4E
designator R?  Resistance: 62mΩ  (hidden comment: *)
Resistor, 62mΩ, ±5%, 1W, 200V, ±800ppm/℃, -55℃~+155℃, SMD 2512; Manufacturer: Uniroyal; Manufacturer Part Number: 25121WJ062LT4E; Supplier 1: LCSC; Supplier Part Number 1: C406893; JLCPCB Part Number: C406893; Power Rating: 1W; Category: Resistors; Package Size: 2512; JLCPCB Basic Part: Yes; Tolerance: ±5%; Voltage Rating: 200V; Temperature Coefficient: ±800ppm/℃; Temperature Rating: -55℃~+155℃; ComponentLink1Description: Datasheet; ComponentLink1URL: https://wmsc.lcsc.com/wmsc/upload/file/pdf/v2/lcsc/2205311945_UNI-ROYAL-Uniroyal-Elec-25121WJ062LT4E_C406893.pdf; ComponentLink2Description: JLCPCB Part URL; ComponentLink2URL: https://jlcpcb.com/partdetail/C406893
pins: 1, 2
1 alternate drawing of the same symbol

## 25121WJ068JT4E
designator R?  Resistance: 6.8Ω  (hidden comment: *)
Resistor, 6.8Ω, ±5%, 1W, 200V, ±200ppm/℃, -55℃~+155℃, SMD 2512; Manufacturer: Uniroyal; Manufacturer Part Number: 25121WJ068JT4E; Supplier 1: LCSC; Supplier Part Number 1: C117848; JLCPCB Part Number: C117848; Power Rating: 1W; Category: Resistors; Package Size: 2512; JLCPCB Basic Part: Yes; Tolerance: ±5%; Voltage Rating: 200V; Temperature Coefficient: ±200ppm/℃; Temperature Rating: -55℃~+155℃; ComponentLink1Description: Datasheet; ComponentLink1URL: https://wmsc.lcsc.com/wmsc/upload/file/pdf/v2/lcsc/2205312316_UNI-ROYAL-Uniroyal-Elec-25121WJ068JT4E_C117848.pdf; ComponentLink2Description: JLCPCB Part URL; ComponentLink2URL: https://jlcpcb.com/partdetail/C117848
pins: 1, 2
1 alternate drawing of the same symbol

## 25121WJ068KT4E
designator R?  Resistance: 680mΩ  (hidden comment: *)
Resistor, 680mΩ, ±5%, 1W, 200V, ±800ppm/℃, -55℃~+155℃, SMD 2512; Manufacturer: Uniroyal; Manufacturer Part Number: 25121WJ068KT4E; Supplier 1: LCSC; Supplier Part Number 1: C621283; JLCPCB Part Number: C621283; Power Rating: 1W; Category: Resistors; Package Size: 2512; JLCPCB Basic Part: Yes; Tolerance: ±5%; Voltage Rating: 200V; Temperature Coefficient: ±800ppm/℃; Temperature Rating: -55℃~+155℃; ComponentLink1Description: Datasheet; ComponentLink1URL: https://wmsc.lcsc.com/wmsc/upload/file/pdf/v2/lcsc/2206011100_UNI-ROYAL-Uniroyal-Elec-25121WJ068KT4E_C621283.pdf; ComponentLink2Description: JLCPCB Part URL; ComponentLink2URL: https://jlcpcb.com/partdetail/C621283
pins: 1, 2
1 alternate drawing of the same symbol

## 25121WJ068LT4E
designator R?  Resistance: 68mΩ  (hidden comment: *)
Resistor, 68mΩ, ±5%, 1W, 200V, ±800ppm/℃, -55℃~+155℃, SMD 2512; Manufacturer: Uniroyal; Manufacturer Part Number: 25121WJ068LT4E; Supplier 1: LCSC; Supplier Part Number 1: C419718; JLCPCB Part Number: C419718; Power Rating: 1W; Category: Resistors; Package Size: 2512; JLCPCB Basic Part: Yes; Tolerance: ±5%; Voltage Rating: 200V; Temperature Coefficient: ±800ppm/℃; Temperature Rating: -55℃~+155℃; ComponentLink1Description: Datasheet; ComponentLink1URL: https://wmsc.lcsc.com/wmsc/upload/file/pdf/v2/lcsc/2205312245_UNI-ROYAL-Uniroyal-Elec-25121WJ068LT4E_C419718.pdf; ComponentLink2Description: JLCPCB Part URL; ComponentLink2URL: https://jlcpcb.com/partdetail/C419718
pins: 1, 2
1 alternate drawing of the same symbol

## 25121WJ075JT4E
designator R?  Resistance: 7.5Ω  (hidden comment: *)
Resistor, 7.5Ω, ±5%, 1W, 200V, ±200ppm/℃, -55℃~+155℃, SMD 2512; Manufacturer: Uniroyal; Manufacturer Part Number: 25121WJ075JT4E; Supplier 1: LCSC; Supplier Part Number 1: C474090; JLCPCB Part Number: C474090; Power Rating: 1W; Category: Resistors; Package Size: 2512; JLCPCB Basic Part: Yes; Tolerance: ±5%; Voltage Rating: 200V; Temperature Coefficient: ±200ppm/℃; Temperature Rating: -55℃~+155℃; ComponentLink1Description: Datasheet; ComponentLink1URL: https://wmsc.lcsc.com/wmsc/upload/file/pdf/v2/lcsc/2206011100_UNI-ROYAL-Uniroyal-Elec-25121WJ075JT4E_C474090.pdf; ComponentLink2Description: JLCPCB Part URL; ComponentLink2URL: https://jlcpcb.com/partdetail/C474090
pins: 1, 2
1 alternate drawing of the same symbol

## 25121WJ075LT4E
designator R?  Resistance: 75mΩ  (hidden comment: *)
Resistor, 75mΩ, ±5%, 1W, 200V, ±800ppm/℃, -55℃~+155℃, SMD 2512; Manufacturer: Uniroyal; Manufacturer Part Number: 25121WJ075LT4E; Supplier 1: LCSC; Supplier Part Number 1: C921011; JLCPCB Part Number: C921011; Power Rating: 1W; Category: Resistors; Package Size: 2512; JLCPCB Basic Part: Yes; Tolerance: ±5%; Voltage Rating: 200V; Temperature Coefficient: ±800ppm/℃; Temperature Rating: -55℃~+155℃; ComponentLink1Description: Datasheet; ComponentLink1URL: https://wmsc.lcsc.com/wmsc/upload/file/pdf/v2/lcsc/2206011045_UNI-ROYAL-Uniroyal-Elec-25121WJ075LT4E_C921011.pdf; ComponentLink2Description: JLCPCB Part URL; ComponentLink2URL: https://jlcpcb.com/partdetail/C921011
pins: 1, 2
1 alternate drawing of the same symbol

## 25121WJ082JT4E
designator R?  Resistance: 8.2Ω  (hidden comment: *)
Resistor, 8.2Ω, ±5%, 1W, 200V, ±200ppm/℃, -55℃~+155℃, SMD 2512; Manufacturer: Uniroyal; Manufacturer Part Number: 25121WJ082JT4E; Supplier 1: LCSC; Supplier Part Number 1: C474277; JLCPCB Part Number: C474277; Power Rating: 1W; Category: Resistors; Package Size: 2512; JLCPCB Basic Part: Yes; Tolerance: ±5%; Voltage Rating: 200V; Temperature Coefficient: ±200ppm/℃; Temperature Rating: -55℃~+155℃; ComponentLink1Description: Datasheet; ComponentLink1URL: https://wmsc.lcsc.com/wmsc/upload/file/pdf/v2/lcsc/2206011100_UNI-ROYAL-Uniroyal-Elec-25121WJ082JT4E_C474277.pdf; ComponentLink2Description: JLCPCB Part URL; ComponentLink2URL: https://jlcpcb.com/partdetail/C474277
pins: 1, 2
1 alternate drawing of the same symbol

## 25121WJ082KT4E
designator R?  Resistance: 820mΩ  (hidden comment: *)
Resistor, 820mΩ, ±5%, 1W, 200V, ±800ppm/℃, -55℃~+155℃, SMD 2512; Manufacturer: Uniroyal; Manufacturer Part Number: 25121WJ082KT4E; Supplier 1: LCSC; Supplier Part Number 1: C56426; JLCPCB Part Number: C56426; Power Rating: 1W; Category: Resistors; Package Size: 2512; JLCPCB Basic Part: Yes; Tolerance: ±5%; Voltage Rating: 200V; Temperature Coefficient: ±800ppm/℃; Temperature Rating: -55℃~+155℃; ComponentLink1Description: Datasheet; ComponentLink1URL: https://wmsc.lcsc.com/wmsc/upload/file/pdf/v2/lcsc/2205312345_UNI-ROYAL-Uniroyal-Elec-25121WJ082KT4E_C56426.pdf; ComponentLink2Description: JLCPCB Part URL; ComponentLink2URL: https://jlcpcb.com/partdetail/C56426
pins: 1, 2
1 alternate drawing of the same symbol

## 25121WJ082LT4E
designator R?  Resistance: 82mΩ  (hidden comment: *)
Resistor, 82mΩ, ±5%, 1W, 200V, ±800ppm/℃, -55℃~+155℃, SMD 2512; Manufacturer: Uniroyal; Manufacturer Part Number: 25121WJ082LT4E; Supplier 1: LCSC; Supplier Part Number 1: C621269; JLCPCB Part Number: C621269; Power Rating: 1W; Category: Resistors; Package Size: 2512; JLCPCB Basic Part: Yes; Tolerance: ±5%; Voltage Rating: 200V; Temperature Coefficient: ±800ppm/℃; Temperature Rating: -55℃~+155℃; ComponentLink1Description: Datasheet; ComponentLink1URL: https://wmsc.lcsc.com/wmsc/upload/file/pdf/v2/lcsc/2206011100_UNI-ROYAL-Uniroyal-Elec-25121WJ082LT4E_C621269.pdf; ComponentLink2Description: JLCPCB Part URL; ComponentLink2URL: https://jlcpcb.com/partdetail/C621269
pins: 1, 2
1 alternate drawing of the same symbol

## 25121WJ091JT4E
designator R?  Resistance: 9.1Ω  (hidden comment: *)
Resistor, 9.1Ω, ±5%, 1W, 200V, ±200ppm/℃, -55℃~+155℃, SMD 2512; Manufacturer: Uniroyal; Manufacturer Part Number: 25121WJ091JT4E; Supplier 1: LCSC; Supplier Part Number 1: C47445; JLCPCB Part Number: C47445; Power Rating: 1W; Category: Resistors; Package Size: 2512; JLCPCB Basic Part: Yes; Tolerance: ±5%; Voltage Rating: 200V; Temperature Coefficient: ±200ppm/℃; Temperature Rating: -55℃~+155℃; ComponentLink1Description: Datasheet; ComponentLink1URL: https://wmsc.lcsc.com/wmsc/upload/file/pdf/v2/lcsc/2206010000_UNI-ROYAL-Uniroyal-Elec-25121WJ091JT4E_C47445.pdf; ComponentLink2Description: JLCPCB Part URL; ComponentLink2URL: https://jlcpcb.com/partdetail/C47445
pins: 1, 2
1 alternate drawing of the same symbol

## 25121WJ091KT4E
designator R?  Resistance: 910mΩ  (hidden comment: *)
Resistor, 910mΩ, ±5%, 1W, 200V, ±800ppm/℃, -55℃~+155℃, SMD 2512; Manufacturer: Uniroyal; Manufacturer Part Number: 25121WJ091KT4E; Supplier 1: LCSC; Supplier Part Number 1: C621285; JLCPCB Part Number: C621285; Power Rating: 1W; Category: Resistors; Package Size: 2512; JLCPCB Basic Part: Yes; Tolerance: ±5%; Voltage Rating: 200V; Temperature Coefficient: ±800ppm/℃; Temperature Rating: -55℃~+155℃; ComponentLink1Description: Datasheet; ComponentLink1URL: https://wmsc.lcsc.com/wmsc/upload/file/pdf/v2/lcsc/2206011100_UNI-ROYAL-Uniroyal-Elec-25121WJ091KT4E_C621285.pdf; ComponentLink2Description: JLCPCB Part URL; ComponentLink2URL: https://jlcpcb.com/partdetail/C621285
pins: 1, 2
1 alternate drawing of the same symbol

## 25121WJ091LT4E
designator R?  Resistance: 91mΩ  (hidden comment: *)
Resistor, 91mΩ, ±5%, 1W, 200V, ±800ppm/℃, -55℃~+155℃, SMD 2512; Manufacturer: Uniroyal; Manufacturer Part Number: 25121WJ091LT4E; Supplier 1: LCSC; Supplier Part Number 1: C419716; JLCPCB Part Number: C419716; Power Rating: 1W; Category: Resistors; Package Size: 2512; JLCPCB Basic Part: Yes; Tolerance: ±5%; Voltage Rating: 200V; Temperature Coefficient: ±800ppm/℃; Temperature Rating: -55℃~+155℃; ComponentLink1Description: Datasheet; ComponentLink1URL: https://wmsc.lcsc.com/wmsc/upload/file/pdf/v2/lcsc/2205312245_UNI-ROYAL-Uniroyal-Elec-25121WJ091LT4E_C419716.pdf; ComponentLink2Description: JLCPCB Part URL; ComponentLink2URL: https://jlcpcb.com/partdetail/C419716
pins: 1, 2
1 alternate drawing of the same symbol